# Altium integrated library Integrated_Library - 02.02.25 - 22.49.IntLib: 792 symbols (part 8 of 11) (continued)
## CMP-019-00011-3
designator U?, comment CJT1117-5.0
Low Dropout Linear Regulator, 1 A, 5 V, 0 to 125 degC, 4-Pin SOT223, RoHS, Tape and Reel; Manufacturer: Jiangsu Changjiang Electronics Technology; RoHS Compliant: Unknown; Mounting Technology: SM; Package Reference: SOT223-4; Case/Package: SOT223-4; Datasheet URL: https://statics3.seeedstudio.com/images/opl/datasheet/1310190P1.pdf; Package Description: 4-Pin Small Outline Transistor, Body 6.3 x 3.5 mm, Pitch 2.3 mm; Package URL: http://www.cj-elec.com/gallery/txUpfile/2013626129718915.pdf; Datasheet Version: Rev. A, 01/2012
footprint JSCJ-SOT223-4_M (SOT223, 4-Leads, Body 6.4x3.7mm, Pitch 2.3mm, IPC Low Density)
footprint JSCJ-SOT223-4_N (SOT223, 4-Leads, Body 6.4x3.7mm, Pitch 2.3mm, IPC Medium Density)
footprint JSCJ-SOT223-4_L (SOT223, 4-Leads, Body 6.4x3.7mm, Pitch 2.3mm, IPC High Density)
pins: 1 GND (power), 2 OUT (power), 3 IN (power), 4 TAB

## CMP-019-00012-3
designator U?, comment CN3065
Lithium Ion Battery Charger for Solar-Powered System, 4.4 to 6 V, 650 uA, -40 to 85 degC, 8-Pin DFN, RoHS; Manufacturer: Consonance Electronic; RoHS Compliant: Unknown; Package Reference: DFN-8; Datasheet URL: http://www.consonance-elec.com/pdf/datasheet/DSE-CN3065.pdf; Manufacturer URL: http://www.consonance-elec.com/; Datasheet Version: Rev. 1.0, 09/2009; Mounting Technology: SM; Case/Package: DFN-8; Package Description: 8-Pin Small Outline No-lead Package, Body 3 x 3 mm, Pitch 0.5 mm
footprint CONS-DFN-8_M (SON, 8-Leads, Body 3.1x3.1mm, Pitch 0.5mm, Thermal Pad 2.4x1.7mm, IPC Low Density)
footprint CONS-DFN-8_L (SON, 8-Leads, Body 3.10x3.10mm, Pitch 0.50mm, Thermal Pad 2.40x1.7mm, IPC High Density)
footprint CONS-DFN-8_N (SON, 8-Leads, Body 3.1x3.1mm, Pitch 0.5mm, Thermal Pad 2.4x1.7mm, IPC Medium Density)
pins: 1 TEMP (in) "Temperature Sense Input. Connecting TEMP pin to NTC thermistor’s output in Lithium ion battery pack. If TEMP pin’s voltage is below 46% of input supply voltage VIN for more than 0.15S, this means that batter(See Datasheet)", 2 ISET (in) "Constant Charge Current Setting and Charge Current Monitor Pin. The charge current is set by connecting a resistor RISET from this pin to GND. When in precharge mode, the ISET pin’s voltage is regulated to 0.2V. When i(See Datasheet)", 3 GND (power) "Ground Terminal.", 4 VIN (power) "Positive Input Supply Voltage. VIN is the power supply to the internal circuit. When VIN drops to within 40mv of the BAT pin voltage, CN3065 enters low power sleep mode, dropping BAT pin’s current to less than 3uA.", 5 BAT (power) "Battery Connection Pin. Connect the positive terminal of the battery to BAT pin. BAT pin draws less than 3uA current in chip disable mode or in sleep mode. BAT pin provides charge current to the battery and provides (See Datasheet)", 6 ~{DONE} (hiz) "Open-Drain Charge termination Status Output. In charge termination status, D\O\N\E\ is pulled low by an internal switch; Otherwise D\O\N\E\ pin is in high impedance state.", 7 ~{CHRG} (hiz) "Open Drain Charge Status Output. When the battery is being charged, the C\H\R\G\  pin is pulled low by an internal switch, otherwise C\H\R\G\ pin is in high impedance state.", 8 FB (in) "Battery Voltage Kevin Sense Input. This Pin can Kelvin sense the battery voltage; Also the regulation voltage in constant voltage mode can be adjusted by connecting an external resistor between FB pin and BAT pin.", 9 EP

## CMP-019-00013-3
designator U?, comment ETA3406S2F-T
Step-Down Converter, 1.5 MHz, 1.2 A, 2.6 to 6 VIN, -40 to 85 degC, 5-Pin SOT23, RoHS; Manufacturer: ETA solution; Datasheet URL: http://datasheet.octopart.com/ETA3406S2F-T-ETA-Solutions-datasheet-62330933.pdf; Package Reference: SOT23-5; Package Description: 5-Pin Small Outline Transistor, Body 2.9 x 1.65 mm, Pitch 0.95 mm; Datasheet Version: Apr-13; Manufacturer URL: http://www.etasolution.com/; Case/Package: SOT23-5; Mounting Technology: SM; RoHS Compliant: Unknown
footprint ETA-SOT23-5_M (SOT23, 5-Leads, Body 3.1x1.8mm, Pitch 0.95mm, IPC Low Density)
footprint ETA-SOT23-5_N (SOT23, 5-Leads, Body 3.1x1.8mm, Pitch 0.95mm, IPC Medium Density)
footprint ETA-SOT23-5_L (SOT23, 5-Leads, Body 3.1x1.8mm, Pitch 0.95mm, IPC High Density)
pins: 1 EN (in) "Enable pin for the IC. Drive this pin to high to enable the part, low to disable.", 2 GND (power) "Ground", 3 SW (power) "Inductor Connection. Connect an inductor Between SW and the regulator output.", 4 IN (power) "Supply Voltage. Bypass with a 10uF ceramic capacitor to GND", 5 FB (in) "Feedback Input. Connect an external resistor divider from the output to FB and GND to set the output to a voltage between 0.6V and VIN"

## CMP-019-00014-3
designator U?, comment MP1496DJ
High-Efficiency, Synchronous, Step-Down Converter, 2 A, 16 V, 500 KHz, -40 to 125 degC, 8-Pin TSOT23, RoHS, Tape and Reel; Manufacturer: Monolithic Power Systems; Package Reference: TSOT23-8; Datasheet URL: http://www.monolithicpower.com/DesktopModules/DocumentManage/API/Document/getDocument?id=443; RoHS Compliant: Unknown; Mounting Technology: SM; Case/Package: TSOT23-8; Manufacturer URL: http://www.monolithicpower.com/; Package Description: 8-Pin Small Outline Package Integrated Circuit, Body 1.6 x 2.9 mm, Pitch 0.65 mm; Datasheet Version: Rev. 1.05, 12/2012
footprint MPS-TSOT23-8_V (SOP, 8-Leads, Body 3x1.7mm, Pitch 0.65mm)
pins: 1 SS "Soft-Start. Connect an external capacitor to program the soft start time for the switch mode regulator.", 2 IN (power) "Supply Voltage. The MP1496 operates from a 4.5V-to-16V input rail. C1 decouples the input rail. Use wide PCB trace to make the connection.", 3 SW "Switch Output. Connect using a wide PCB trace.", 4 GND (power) "System Ground. Reference ground of the regulated output voltage. Use special care in PCB layout: Connect to GND with copper and vias.", 5 BST "Bootstrap. Connect a capacitor between SW and BST pins to form a floating supply across the high-side switch driver. A 10ohm resistor placed between SW and BST cap. is strongly recommended to reduce SW spike voltage.", 6 EN/SYNC "Enable/Synchronize. EN high to enable the MP1496. Apply an external clock to EN/SYNC pin to change the switching frequency", 7 VCC (power) "Bias Supply. Decouple with 0.1uF-to-0.22uF cap. The capacitance should not exceed 0.22uF. VCC capacitor should be put closely to VCC pin and GND pin.", 8 FB (in) "Feedback. Connect to the tap of an external resistor divider from the output to GND to set the output voltage. The frequency fold-back comparator lowers the oscillator frequency when the FB voltage is below 400mV to prevent (See Datasheet)"

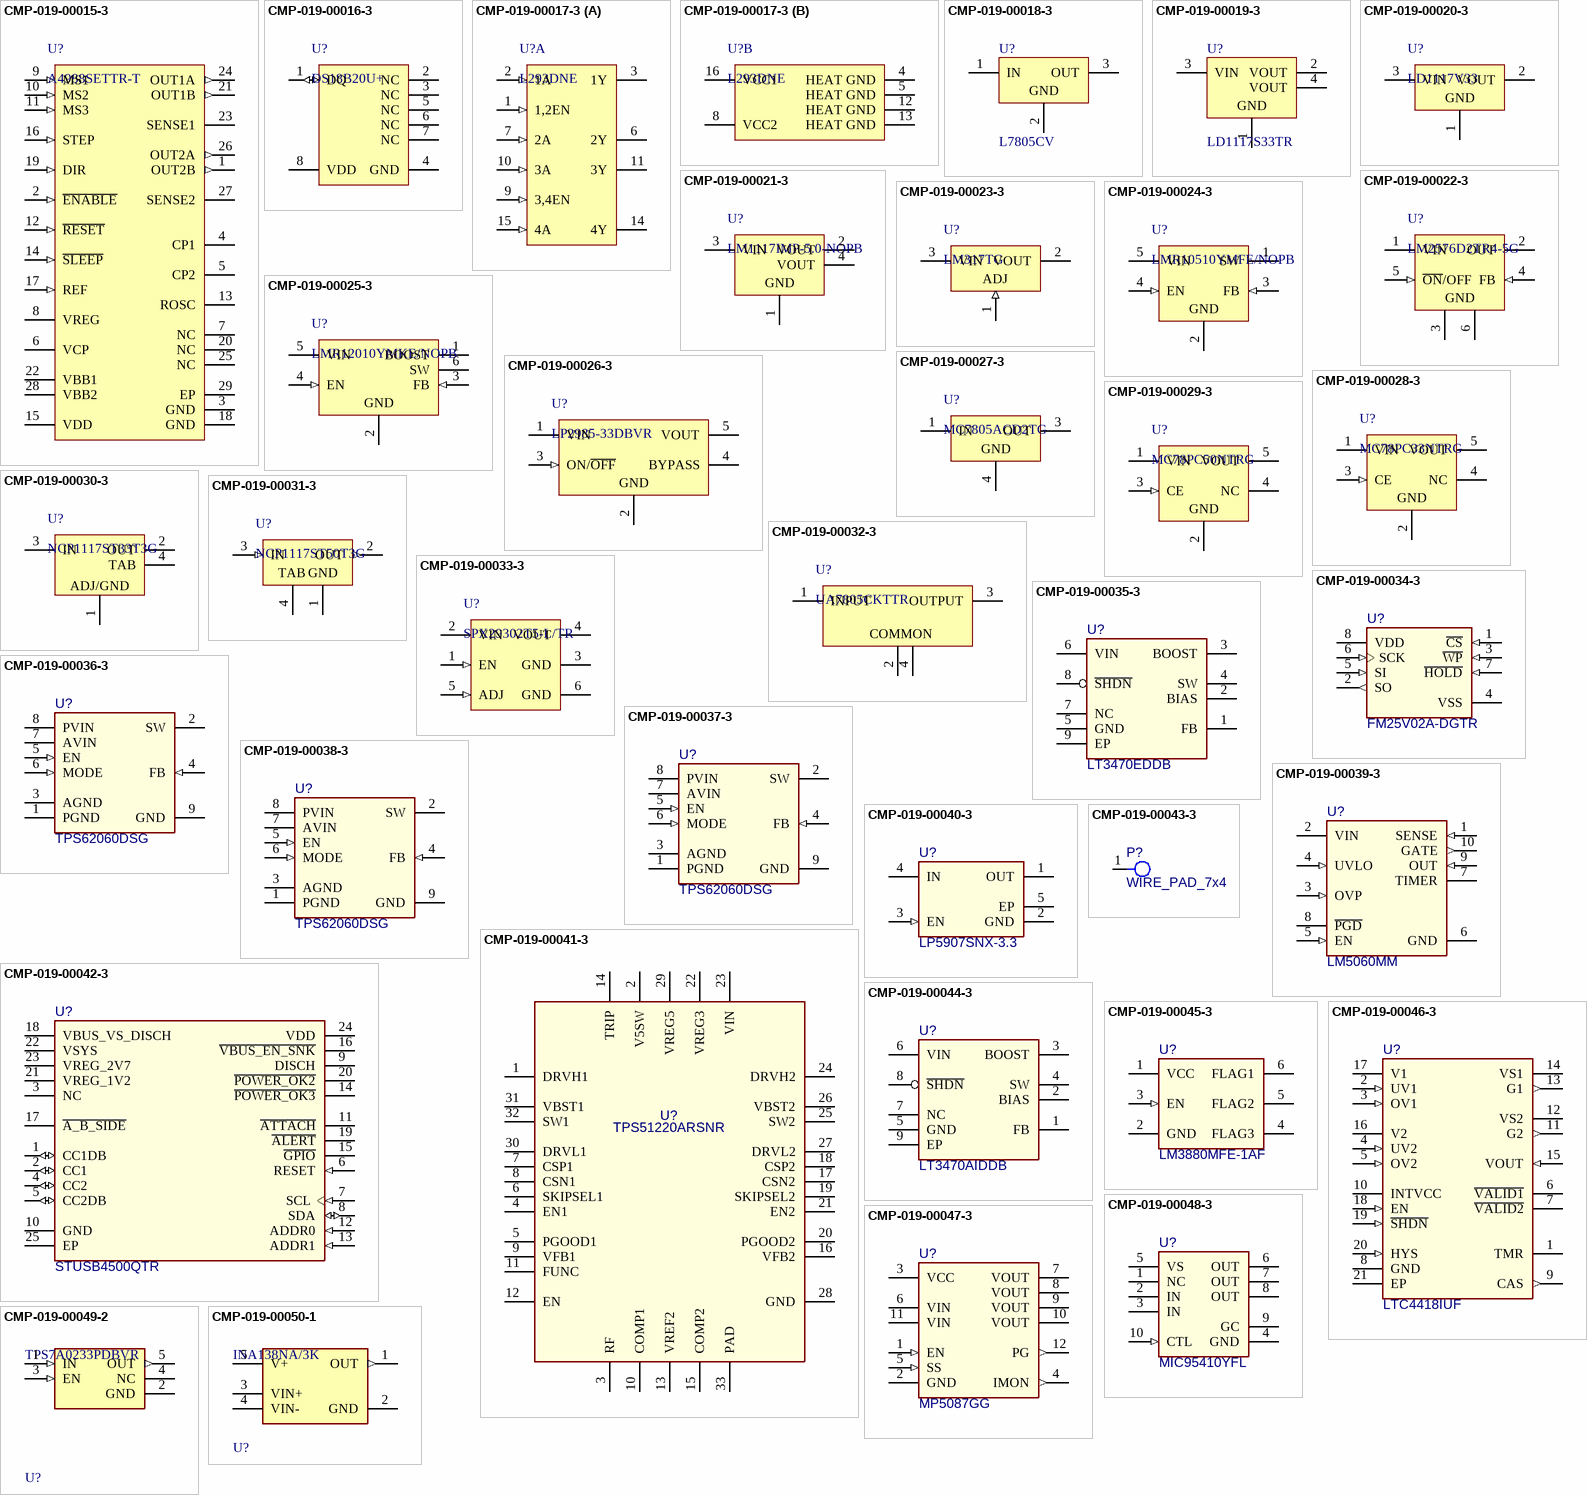
[diagram p19: symbols CMP-019-00015-3 to CMP-019-00050-1]

## CMP-019-00015-3
designator U?, comment A4988SETTR-T
DMOS Microstepping Driver with Translator and Overcurrent Protection, 3 to 5.5 V, -20 to 85 degC, 28-Pin QFN (ET), RoHS, Tape and Reel; Manufacturer: Allegro Microsystems; Output Voltage: 35V; Max Supply Voltage: 5V; Min Supply Voltage: 3V; Outputs: 1; Output Current: 2A; Max Operating Temperature: 85°C; Package Quantity: 1500; Packaging: TapeandReel; Pins: 28; RoHS Compliant: True; Datasheet Version: Rev. 6, 01/2016; Min Operating Temperature: -20°C; Mounting Technology: SM; Datasheet URL: http://www.allegromicro.com/en/Products/Part_Numbers/4988/4988.pdf; Package Reference: ET28; Manufacturer URL: http://www.allegromicro.com/; Case/Package: QFN; Package Description: 28-Pin Quad Flat No-lead Package, Body 5.15 x 5.15 mm, Pitch 0.5 mm
footprint ALEG-ET-28_V (QFN, 28-Leads, Body 5.15x5.15mm, Pitch 0.5mm, Thermal Pad 3.15x3.15mm)
pins: 1 OUT2B (out) "DMOS Full Bridge 2 Output B", 2 ~{ENABLE} (in) "Logic input", 3 GND (power) "Ground", 4 CP1 "Charge pump capacitor terminal", 5 CP2 "Charge pump capacitor terminal", 6 VCP "Reservoir capacitor terminal", 7 NC "No connection", 8 VREG "Regulator decoupling terminal", 9 MS1 (in) "Logic input", 10 MS2 (in) "Logic input", 11 MS3 (in) "Logic input", 12 ~{RESET} (in) "Logic input", 13 ROSC "Timing set", 14 ~{SLEEP} (in) "Logic input", 15 VDD (power) "Logic supply", 16 STEP (in) "Logic input", 17 REF (in) "Gm reference voltage input", 18 GND (power) "Ground", 19 DIR (in) "Logic input", 20 NC "No connection", 21 OUT1B (out) "DMOS Full Bridge 1 Output B", 22 VBB1 (power) "Load supply", 23 SENSE1 "Sense resistor terminal for Bridge 1", 24 OUT1A (out) "DMOS Full Bridge 1 Output A", 25 NC "No connection", 26 OUT2A (out) "DMOS Full Bridge 2 Output A", 27 SENSE2 "Sense resistor terminal for Bridge 2", 28 VBB2 (power) "Load supply", 29 EP (power) "Exposed pad for enhanced thermal dissipation"

## CMP-019-00016-3
designator U?, comment DS18B20U+
Programmable Resolution 1-Wire Digital Thermometer, -55 to 125 degC, 8-Pin SOP, RoHS, Tube; Manufacturer: Maxim; Interface: Serial; Max Supply Voltage (DC): 5V; Min Supply Voltage (DC): 3V; Nominal Supply Current: 1mA; Output Current: 4mA; Max Supply Voltage: 5.5V; Datasheet Version: Rev. 4, 01/2015; Package URL: http://pdfserv.maximintegrated.com/package_dwgs/21-0036.PDF; RoHS Compliant: True; Packaging: Rail/Tube; Datasheet URL: http://datasheets.maximintegrated.com/en/ds/DS18B20.pdf; Package Reference: U8+1; Case/Package: MSOP; Mounting Technology: SM; Min Operating Temperature: -55°C; Package Quantity: 50; Package Description: 8-Pin Small Outline Package Integrated Circuit, Body 3 x 3 mm, Pitch 0.65 mm; Max Operating Temperature: 125°C; Min Supply Voltage: 3V; Pins: 8; Manufacturer URL: http://www.maximintegrated.com/
footprint MAXM-U8+1_V (SOP, 8-Leads, Body 3.1x3.1mm, Pitch 0.65mm)
pins: 1 DQ (io) "Data Input/Output. Open-drain 1-Wire interface pin. Also provides power to the device when used in parasite power mode (see the Powering the DS18B20 section.)", 2 NC "No Connection", 3 NC "No Connection", 4 GND (power) "Ground", 5 NC "No Connection", 6 NC "No Connection", 7 NC "No Connection", 8 VDD (power) "Optional VDD. VDD must be grounded for operation in parasite power mode."

## CMP-019-00017-3
designator U?, comment L293DNE
Quadruple Half-H Driver, 1.2 A Peak, 4.5 to 36 V, 0 to 70 degC, 16-Pin DIP (NE), Pb-Free (RoHS), Tube; Manufacturer: Texas Instruments; Interface: Parallel; Package Version: 4040054/B, 04/1995; Outputs: 4; Min Supply Voltage: 4.5V; Max Supply Voltage: 36V; Output Current: 600mA; Manufacturer URL: http://www.ti.com/; Package Reference: NE0016A; Min Operating Temperature: 0°C; Package Quantity: 25; Datasheet Version: SLRS008D, 01/2016; Packaging: Rail/Tube; Case/Package: DIP; Package Description: 16-Pin Through Hole Device, Body 19.8 x 6.35 mm, Pitch 2.54 mm, Row Spacing 7.62 mm; Package URL: http://www.ti.com/lit/ml/mpdi003/mpdi003.pdf; Max Operating Temperature: 70°C; RoHS Compliant: True; Mounting Technology: TH; Datasheet URL: http://www.ti.com/general/docs/lit/getliterature.tsp?genericPartNumber=l293d&fileType=pdf; Output Voltage: 36V; Pins: 16
footprint NE0016A (DIP, 16-Leads, Body 19.8x6.6mm, Pitch 2.54mm, Row Spacing 7.62mm)
part A pins: 1 1,2EN (in), 2 1A (in), 3 1Y (hiz), 6 2Y (hiz), 7 2A (in), 9 3,4EN (in), 10 3A (in), 11 3Y (hiz), 14 4Y (hiz), 15 4A (in)
part B pins: 4 HEAT GND (power), 5 HEAT GND (power), 8 VCC2 (power), 12 HEAT GND (power), 13 HEAT GND (power), 16 VCC1 (power)

## CMP-019-00018-3
designator U?, comment L7805CV
Positive Voltage Regulator IC, 1.5 A, 5 V, 0 to 125 degC, 3-Pin TO-220, RoHS, Tube; Manufacturer: STMicroelectronics; Max Input Voltage: 35V; Min Supply Voltage: 8V; Nominal Output Voltage: 5V; Outputs: 1; Output Current: 1.5A; Dropout Voltage: 2V; Max Supply Voltage: 20V; Min Input Voltage: 7V; Datasheet Version: Rev 30, 09/2012; Min Operating Temperature: 0°C; Manufacturer URL: http://www.st.com/; Pins: 3; Mounting Technology: TH; Output Voltage: 5V; RoHS Compliant: True; Max Ouput Current: 1.5A; Datasheet URL: https://datasheet.ciiva.com/15111/getdatasheetpartid-44136-15111027.pdf; Packaging: Rail/Tube; Max Operating Temperature: 125°C; Case/Package: TO-220; Package Quantity: 50
footprint TO220 (TO, Thru-Hole, Vertical, Heatsink Mounted; 3 In-Line Leads; Pitch 2.54 mm)
pins: 1 IN (power), 2 GND (power), 3 OUT (power)

## CMP-019-00019-3
designator U?, comment LD1117S33TR
Low Drop Positive Voltage Regulator, 800 mA, Fixed 3.3 V Output, 0 to 125 degC, 3-Pin TO-220, RoHS, Tape and Reel; Manufacturer: STMicroelectronics; Max Supply Voltage: 15V; Dropout Voltage: 1.1V; Power: 12W; Output Current: 950mA; Min Input Voltage: 4.75V; Nominal Output Voltage: 3.3V; Max Ouput Current: 1.3A; Outputs: 1; Packaging: TapeandReel; Datasheet Version: Rev. 33, 11/2013; RoHS Compliant: True; Mounting Technology: SM; Max Input Voltage: 15V; Max Operating Temperature: 125°C; Package Reference: SOT-223; Package Quantity: 2500; Package Description: 4-Pin Small Outline Transistor, Body 6.5 x 3.5 mm, Pitch 2.3 mm; Case/Package: TO-261-4; Min Operating Temperature: 0°C; Datasheet URL: http://www.farnell.com/datasheets/1776449.pdf; Min Supply Voltage: 4.75V; Pins: 3; Output Voltage: 3.3V; Manufacturer URL: http://www.st.com/
footprint STM-SOT-223_M (SOT223, 4-Leads, Body 6.7x3.7mm, Pitch 2.3mm, IPC Low Density)
footprint STM-SOT-223_L (SOT223, 4-Leads, Body 6.7x3.7mm, Pitch 2.3mm, IPC High Density)
footprint STM-SOT-223_N (SOT223, 4-Leads, Body 6.7x3.7mm, Pitch 2.3mm, IPC Medium Density)
pins: 1 GND (power), 2 VOUT (power), 3 VIN (power), 4 VOUT (power)

## CMP-019-00020-3
designator U?, comment LD1117V33
Low Drop Positive Voltage Regulator, 800 mA, Fixed 3.3 V Output, 0 to 125 degC, 3-Pin TO-220, RoHS, Tube; Manufacturer: STMicroelectronics; Max Supply Voltage: 15V; Max Ouput Current: 800mA; Output Voltage: 3.3V; Power: 12W; Min Supply Voltage: 4.75V; Output Current: 1.3A; Outputs: 1; Min Input Voltage: 4.4V; Dropout Voltage: 1.1V; Datasheet Version: Rev. A, 07/2003; Case/Package: TO-220-3; Package Quantity: 50; Max Input Voltage: 15V; Manufacturer URL: http://www.st.com/; Min Operating Temperature: 0°C; Datasheet URL: http://www.farnell.com/datasheets/1776449.pdf; Max Operating Temperature: 125°C; Nominal Output Voltage: 3.3V; RoHS Compliant: True; Pins: 3; Packaging: Rail/Tube
footprint STM-TO220-3 (FM, 3-Leads, Body 10.4x4.6mm, Pitch 2.55mm)
pins: 1 GND (power), 2 VOUT (power), 3 VIN (power)

## CMP-019-00021-3
designator U?, comment LM1117IMP-5.0-NOPB
Low-Dropout Linear Regulator, 800 mA, -40 to 125 degC, 4-Pin SOT-223 (DCY), Green (RoHS & no Sb/Br), Tape and Reel; Manufacturer: Texas Instruments; Dropout Voltage: 1.2V; Nominal Output Voltage: 5V; Max Ouput Current: 800mA; Outputs: 1; Min Input Voltage: 2.6V; Max Input Voltage: 15V; Manufacturer URL: http://www.ti.com/; Max Operating Temperature: 125°C; Packaging: TapeandReel; RoHS Compliant: True; Output Voltage: 5V; Pins: 4; Package Description: 4-Pin Small Outline Transistor, Body 6.5 x 3.5 mm, Pitch 2.3 mm; Min Operating Temperature: -40°C; Mounting Technology: SM; Output Current: 800mA; Case/Package: SOT-223; Datasheet Version: SNOS412N, 01/2016; Datasheet URL: http://www.ti.com/lit/ds/symlink/lm1117.pdf; Package Reference: DCY0004A
footprint DCY0004A_M (SOT223, 4-Leads, Body 6.7x3.7mm, Pitch 2.3mm, IPC Low Density)
footprint DCY0004A_N (SOT223, 4-Leads, Body 6.7x3.7mm, Pitch 2.3mm, IPC Medium Density)
footprint DCY0004A_L (SOT223, 4-Leads, Body 6.5x3.5mm, Pitch 2.3mm, IPC High Density)
pins: 1 GND (power) "Ground pin for fixed output option.", 2 VOUT (power) "Output voltage pin for the regulator", 3 VIN (power) "Input voltage pin for the regulator", 4 VOUT (power) "Output voltage pin for the regulator"

## CMP-019-00022-3
designator U?, comment LM2576D2TR4-5G
Step-Down Switching Regulator, 3 A, 5 V, -40 to 125 degC, 5-Pin D2PAK (936A-02), RoHS, Tape and Reel; Manufacturer: ON Semiconductor; Min Input Voltage: 7V; Output Voltage: 5V; Frequency: 52kHz; Outputs: 1; Efficiency: 77%; Output Current: 3A; Max Input Voltage: 45V; Package Description: 5-Pin Transistor Outline, Body 10.02 x 9.1945 mm, Pitch 1.702 mm; Mounting Technology: SM; Min Operating Temperature: -40°C; RoHS Compliant: True; Package Quantity: 800; Datasheet Version: Rev. 8, 01/2006; Package Reference: D2PAK-5-936A-02; Manufacturer URL: http://www.onsemi.com/; Datasheet URL: http://www.onsemi.com/pub_link/Collateral/LM2576-D.PDF; Max Ouput Current: 3A; Max Operating Temperature: 125°C; Packaging: TapeandReel; Case/Package: TO-263-6
footprint ONSC-D2PAK-5-936A-02_V (DPAK, 5-Leads, Body 10.02x9.194mm, Pitch 1.702mm)
pins: 1 VIN (power) "This pin is the positive input supply for the LM2576 step-down switching regulator. In order to minimize voltage transients and to supply the switching currents needed by the regulator, a suitable input bypass capacitor must (See Datasheet)", 2 OUT (power) "This is the emitter of the internal switch. The saturation voltage Vsat of this output switch is typically 1.5 V. It should be kept in mind that the PCB area connected to this pin should be kept to a minimum in order to (See Datasheet)", 3 GND (power) "Circuit ground pin. See the information about the printed circuit board layout.", 4 FB (in) "This pin senses regulated output voltage to complete the feedback loop. The signal is divided by the internal resistor divider network R2, R1 and applied to the non-inverting input of the internal error amplifier. In the (See Datasheet)", 5 ~{ON}/OFF (in) "It allows the switching regulator circuit to be shut down using logic level signals, thus dropping the total input supply current to approximately 80 uA. The input threshold voltage is typically 1.4 V. Applying a voltage (See Datasheet)", 6 GND (power) "Heatsink surface (shown as terminal 6 in case outline drawing) is connected to Pin 3"

## CMP-019-00023-3
designator U?, comment LM317TG
Adjustable Output, Positive Voltage Regulator, 1.5 A, 0 to 125 degC, 3-Pin TO-220 (221AB-01), Pb-Free, Rail; Manufacturer: ON Semiconductor; Outputs: 1; Max Input Voltage: 40V; Min Input Voltage: 4.2V; Output Current: 1.5A; Output Voltage: 1.2V; Package Version: Rev. A, 11/2010; Mounting Technology: TH; Case/Package: TO-220; Package Description: 3-Pin Flange Mount, Vertical Straight Lead, Body 9.97 x 4.445 mm, Pitch 2.54 mm; Package Reference: TO-220-3-221AB-01; Manufacturer URL: http://www.onsemi.com/; Package Quantity: 50; Datasheet Version: Rev. 14, 01/2016; Max Ouput Current: 1.5A; Min Operating Temperature: 0°C; Packaging: Rail/Tube; Datasheet URL: http://www.onsemi.com/pub_link/Collateral/LM317-D.PDF; Max Operating Temperature: 125°C; RoHS Compliant: True; Pins: 3
footprint ONSC-TO-220-3-221AB-01 (FM, 3-Leads, Body 10.3x4.85mm, Pitch 2.54mm)
pins: 1 ADJ (in), 2 VOUT (power), 3 VIN (power)

## CMP-019-00024-3
designator U?, comment LMR10510YMFE/NOPB
Simple Switcher, Step-Down Voltage Regulator, 3 to 5.5 V Input, 1 A, 0.6 to 4.5 V Output, -40 to 125 degC, 5-Pin SOT-23 (DBV), Green (RoHS & no Sb/Br), Tape and Reel; Manufacturer: Texas Instruments; Max Ouput Current: 1A; Max Input Voltage: 5.5V; Outputs: 1; Min Input Voltage: 3V; Switching Frequency: 3MHz; Output Voltage: 4.5V; Case/Package: SOT-23-5; Pins: 5; Min Operating Temperature: -40°C; Package Description: 5-Pin Small Outline Transistor, Body 2.9 x 1.6 mm, Pitch 0.95 mm; Package Quantity: 250; Package Reference: DBV0005A; Datasheet URL: http://www.ti.com/lit/ds/symlink/lmr10510.pdf; Frequency: 3MHz; Mounting Technology: SM; Manufacturer URL: http://www.ti.com/; Datasheet Version: SNVS727B, 04/2013; Max Operating Temperature: 125°C; Packaging: TapeandReel; Output Current: 1A; Package URL: http://www.ti.com/lit/ml/mpds018l/mpds018l.pdf; RoHS Compliant: True
footprint DBV0005A_L (SOT23, 5-Leads, Body 3.05x1.75mm, Pitch 0.95mm, IPC High Density)
footprint DBV0005A_N (SOT23, 5-Leads, Body 3.05x1.75mm, Pitch 0.95mm, IPC Medium Density)
footprint DBV0005A_M (SOT23, 5-Leads, Body 3.05x1.75mm, Pitch 0.95mm, IPC Low Density)
pins: 1 SW (power) "Switch node. Connect to the inductor, output diode.", 2 GND (power) "Signal and power ground pin. Place the bottom resistor of the feedback network as close as possible to this pin.", 3 FB (in) "Feedback pin. Connect FB to external resistor divider to set output voltage.", 4 EN (in) "Shutdown control input. Logic high enables operation. Do not allow this pin to float or be greater than VIN + 0.3V.", 5 VIN (power) "input supply voltage."

## CMP-019-00025-3
designator U?, comment LMR12010YMKE/NOPB
Simple Switcher(R), Step-Down Voltage Regulator, 3 to 20 V Input, 1 A, 0.8 to 17 V Output, -40 to 125 degC, 6-Pin SOT23 (DDC), Green (RoHS & no Sb/Br), Tape and Reel; Manufacturer: Texas Instruments; Outputs: 1; Output Voltage: 17V; Switching Frequency: 3MHz; Max Input Voltage: 20V; Efficiency: 90%; Min Input Voltage: 3V; Max Ouput Current: 1A; RoHS Compliant: True; Case/Package: SOT-23-6; Package Quantity: 250; Frequency: 3MHz; Pins: 6; Manufacturer URL: http://www.ti.com/; Package URL: http://www.ti.com/lit/ml/mpds124d/mpds124d.pdf; Max Operating Temperature: 125°C; Min Operating Temperature: -40°C; Package Reference: DDC0006A; Datasheet URL: http://www.ti.com/lit/ds/symlink/lmr12010.pdf; Datasheet Version: SNVS731A, 09/2011; Packaging: TapeandReel; Output Current: 1A; Package Description: 6-Pin Small Outline Transistor, Body 2.9 x 1.6 mm, Pitch 0.95 mm; Mounting Technology: SM
footprint DDC0006A_M (SOT23, 6-Leads, Body 3.05x1.75mm, Pitch 0.95mm, IPC Low Density)
footprint DDC0006A_N (SOT23, 6-Leads, Body 3.05x1.75mm, Pitch 0.95mm, IPC Medium Density)
footprint DDC0006A_L (SOT23, 6-Leads, Body 3.05x1.75mm, Pitch 0.95mm, IPC High Density)
pins: 1 BOOST "Boost voltage that drives the internal NMOS control switch. A bootstrap capacitor is connected between the BOOST and SW pins.", 2 GND (power) "Signal and Power ground pin. Place the bottom resistor of the feedback network as close as possible to this pin for accurate regulation.", 3 FB (in) "Feedback pin. Connect FB to the external resistor divider to set output voltage.", 4 EN (in) "Enable control input. Logic high enables operation. Do not allow this pin to float or be greater than VIN + 0.3V.", 5 VIN (power) "Input supply voltage. Connect a bypass capacitor to this pin.", 6 SW (power) "Output switch. Connects to the inductor, catch diode, and bootstrap capacitor."

## CMP-019-00026-3
designator U?, comment LP2985-33DBVR
Single Output Low Noise LDO, 150 mA, Fixed 3.3 V Output, 1.5% Tolerance, 2.2 to 16 V Input, Low IQ, 5-Pin SOT-23 (DBV), -40 to 125 degC, Green (RoHS & no Sb/Br), Tape and Reel; Manufacturer: Texas Instruments; Output Current: 150mA; Package Version: 4073253-4/N, 12/2014; Outputs: 1; Dropout Voltage: 3mV; Output Voltage: 3.3V; Max Input Voltage: 16V; Min Input Voltage: 2.2V; Package Description: 5-Pin Small Outline Transistor, Body 2.9 x 1.6 mm, Pitch 0.95 mm; Mounting Technology: SM; Min Operating Temperature: -40°C; Case/Package: SOT-23-5; Datasheet Version: SLVS522O, 01/2015; Package Reference: DBV5; Max Ouput Current: 150mA; Max Operating Temperature: 125°C; RoHS Compliant: True; Packaging: TapeandReel; Nominal Output Voltage: 3.3V; Package Quantity: 3000; Package URL: http://www.ti.com/lit/ml/mpds018l/mpds018l.pdf; Pins: 16; Manufacturer URL: http://www.ti.com/; Datasheet URL: http://www.ti.com/lit/ds/symlink/lp2985.pdf
footprint TI-DBV5_V (SOT23, 5-Leads, Body 3.05x1.75mm, Pitch 0.95mm)
pins: 1 VIN (power), 2 GND (power), 3 ON/~{OFF} (in), 4 BYPASS, 5 VOUT (power)

## CMP-019-00027-3
designator U?, comment MC7805ACD2TG
Positive Voltage Regulator, 5 V Output Voltage, 1 A, 0 to 125 degC, 3-Pin D2PAK (936-03), Pb-Free, Tube; Manufacturer: ON Semiconductor; Min Input Voltage: 7V; Package Version: Rev. E, 09/2015; Output Voltage: 5V; Outputs: 1; Max Input Voltage: 35V; Output Current: 1A; Dropout Voltage: 2V; Mounting Technology: SM; Package Quantity: 50; Manufacturer URL: http://www.onsemi.com/; Package Reference: D2PAK-3-936-03; Nominal Output Voltage: 5V; Packaging: Rail/Tube; Max Operating Temperature: 125°C; Datasheet URL: http://www.onsemi.com/pub_link/Collateral/MC7800-D.PDF; RoHS Compliant: True; Datasheet Version: Rev. 27, 11/2014; Case/Package: TO-263-3; Min Operating Temperature: 0°C; Max Ouput Current: 1A; Package Description: 3-Pin Flange Mount, Body 10.02 x 9.1945 mm, Pitch 2.54 mm; Package URL: http://www.onsemi.com/pub_link/Collateral/936-03.PDF; Pins: 3
footprint ONSC-D2PAK-3-936-03_V (DPAK, 3-Leads, Body 10.24x9.35mm, Pitch 2.54mm)
pins: 1 IN (power), 3 OUT (power), 4 GND (power)

## CMP-019-00028-3
designator U?, comment MC78PC33NTRG
Low Noise Low Drop Out (LDO) Linear Voltage Regulator, 3.3 V Output Voltage, 150 mA, -40 to 85 degC, 5-Pin SOT-23 (1212-01), Pb-Free, Tape and Reel; Manufacturer: ON Semiconductor; Outputs: 1; Power Rating: 250mW; Nominal Output Voltage: 3.3V; Min Input Voltage: 4.3V; Dropout Voltage: 300mV; Max Ouput Current: 150mA; Max Input Voltage: 8V; Package Quantity: 3000; Mounting Technology: SM; Case/Package: SOT-23-5; RoHS Compliant: True; Datasheet Version: Rev. 6, 06/2005; Packaging: TapeandReel; Max Operating Temperature: 85°C; Power: 250mW; Output Voltage: 3.3V; Package Reference: SOT-23-5-1212-01_O; Manufacturer URL: http://www.onsemi.com/; Package Description: 5-Pin Small Outline Transistor, Body 2.9 x 1.65 mm, Pitch 0.95 mm; Output Current: 150mA; Datasheet URL: http://www.onsemi.com/pub_link/Collateral/MC78PC00-D.PDF; Min Operating Temperature: -40°C; Pins: 5
footprint ONSC-SOT-23-5-1212-01_O_V (SOT23, 5-Leads, Body 3x1.80mm, Pitch 0.95mm)
pins: 1 VIN (power) "Input Pin", 2 GND (power) "Ground Pin", 3 CE (in) "Chip Enable Pin", 4 NC "No Connection", 5 VOUT (power) "Output Pin"

## CMP-019-00029-3
designator U?, comment MC78PC50NTRG
Low Noise Low Drop Out (LDO) Linear Voltage Regulator, 5 V Output Voltage, 150 mA, -40 to 85 degC, 5-Pin SOT-23 (1212-01), Pb-Free, Tape and Reel; Manufacturer: ON Semiconductor; Dropout Voltage: 260mV; Outputs: 1; Power: 250mW; Output Current: 150mA; Max Input Voltage: 8V; Output Voltage: 5V; Package Quantity: 3000; Packaging: TapeandReel; Max Operating Temperature: 85°C; Mounting Technology: SM; Pins: 5; Datasheet Version: Rev. 6, 06/2005; Min Operating Temperature: -40°C; Package Description: 5-Pin Small Outline Transistor, Body 2.9 x 1.65 mm, Pitch 0.95 mm; Datasheet URL: http://www.onsemi.com/pub_link/Collateral/MC78PC00-D.PDF; RoHS Compliant: True; Case/Package: SOT-23-5; Manufacturer URL: http://www.onsemi.com/; Package Reference: SOT-23-5-1212-01_O
footprint ONSC-SOT-23-5-1212-01_O_V (SOT23, 5-Leads, Body 3x1.80mm, Pitch 0.95mm)
pins: 1 VIN (power) "Input Pin", 2 GND (power) "Ground Pin", 3 CE (in) "Chip Enable Pin", 4 NC "No Connection", 5 VOUT (power) "Output Pin"

## CMP-019-00030-3
designator U?, comment NCP1117ST33T3G
Low-Dropout Positive Fixed Voltage Regulator, 1 A, 3.3 V Output Voltage, 0 to 125 degC, 4-Pin SOT-223 (318H-01), Pb-Free, Tape and Reel; Manufacturer: ON Semiconductor; Max Supply Voltage: 15V; Min Input Voltage: 3.5V; Max Ouput Current: 1A; Output Voltage: 3.3V; Outputs: 1; Min Supply Voltage: 4.75V; Max Input Voltage: 20V; Dropout Voltage: 1.1V; Package Reference: SOT-223-4-318H-01_A; Package Quantity: 4000; Manufacturer URL: http://www.onsemi.com/; Mounting Technology: SM; Output Current: 1A; Min Operating Temperature: 0°C; Datasheet URL: http://www.onsemi.com/pub_link/Collateral/NCP1117-D.PDF; RoHS Compliant: True; Pins: 3; Case/Package: SOT-223-4; Packaging: TapeandReel; Max Operating Temperature: 125°C; Package Description: 4-Pin Small Outline Transistor, Body 6.5 x 3.5 mm, Pitch 2.3 mm; Nominal Output Voltage: 3.3V; Datasheet Version: Rev. 27, 09/2014
footprint ONSC-SOT-223-4-318H-01_A_V (SOT223, 4-Leads, Body 6.7x3.7mm, Pitch 2.3mm)
pins: 1 ADJ/GND, 2 OUT (power), 3 IN (power), 4 TAB

## CMP-019-00031-3
designator U?, comment NCP1117ST50T3G
Low-Dropout Positive Fixed Voltage Regulator, 1 A, 5 V Vout, 0 to 125 degC, 4-Pin SOT-223, Pb-Free, Tape and Reel; Manufacturer: ON Semiconductor; Current Rating: -600A; Output Voltage: 5V; Max Ouput Current: 1A; Max Input Voltage: 20V; Outputs: 1; Dropout Voltage: 1.2V; Min Input Voltage: 3.5V; Datasheet Version: Rev. 26, 08/2013; Package Quantity: 4000; Package Description: 4-Pin Small Outline Transistor, Body 6.5 x 3.5 mm, Pitch 2.3 mm; RoHS Compliant: True; Max Operating Temperature: 125°C; Nominal Output Voltage: 5V; Datasheet URL: https://datasheet.ciiva.com/28483/1748260-28483320.pdf; Min Operating Temperature: 0°C; Manufacturer URL: http://www.onsemi.com/; Output Current: 1A; Pins: 3; Mounting Technology: SM; Package Reference: SOT-223-4-318H-01_A; Case/Package: TO-261-4; Packaging: TapeandReel
footprint ONSC-SOT-223-4-318H-01_A_V (SOT223, 4-Leads, Body 6.7x3.7mm, Pitch 2.3mm)
pins: 1 GND (power), 2 OUT (out), 3 IN (in), 4 TAB (power)

## CMP-019-00032-3
designator U?, comment UA7805CKTTR
Fixed Positive Voltage Regulator, 7 to 25 V, 1.5 A, 0 to 125 degC, 3-Pin DDPAK (KTT), Green (RoHS & no Sb/Br), Tape and Reel; Manufacturer: Texas Instruments; Max Ouput Current: 1.5A; Min Input Voltage: 7V; Nominal Output Voltage: 5V; Outputs: 1; Dropout Voltage: 2V; Max Input Voltage: 25V; Manufacturer URL: http://www.ti.com/; Package Reference: KTT0003A; Pins: 3; Min Operating Temperature: 0°C; Mounting Technology: SM; Package Quantity: 500; Packaging: TapeandReel; Datasheet URL: http://www.ti.com/lit/ds/symlink/ua7805.pdf; Case/Package: TO-263-4; Output Voltage: 5V; RoHS Compliant: True; Datasheet Version: SLVS056P, 01/2015; Output Current: 1.5A; Package Description: 3-Pin Surface Mount Device, Body 10.16 x 9.015 mm, Pitch 2.54 mm; Max Operating Temperature: 125°C
footprint KTT0003A_V (DPAK, 3-Leads, Body 10.65x9.65mm, Pitch 2.54mm)
pins: 1 INPUT (power) "Supply Input", 2 COMMON (power) "Ground", 3 OUTPUT (power) "Voltage Output", 4 COMMON (power) "Ground"

## CMP-019-00033-3
designator U?, comment SPX29302T5-L/TR
Highly Accurate Voltage Regulator, 3 A, 1.25 to 16 V, -40 to 125 degC, 6-Pin DPAK, RoHS, Tape and Reel; Manufacturer: Exar Corporation; Pins: 6; Manufacturer URL: https://www.exar.com/; Package Description: 6-Pin Transistor Outline, Body 9.015 x 10.16 mm, Pitch 1.7 mm; Datasheet URL: https://www.exar.com/content/document.ashx?id=1328; Mounting Technology: SM; Max Operating Temperature: 125°C; RoHS Compliant: True; Package Reference: DPAK; Packaging: TapeandReel; Datasheet Version: Rev. 2.1.0, 10/2011; Min Operating Temperature: -40°C; Voltage: 1.25to16V; Case/Package: DPAK
footprint EXAR-TO263-5_N (D2-PAK, 6-Pads, Body 9.02x10.15mm, IPC Medium Density)
footprint EXAR-TO263-5_L (D2-PAK, 6-Pads, Body 9.02x10.15mm, IPC High Density)
footprint EXAR-TO263-5_M (D2-PAK, 6-Pads, Body 9.02x10.15mm, IPC Low Density)
pins: 1 EN (in), 2 VIN (power), 3 GND (power), 4 VOUT (power), 5 ADJ (in), 6 GND (power)

## CMP-019-00034-3
designator U?, comment FM25V02A-DGTR
REEL / F-RAM Memory Serial; Speed: 40MHz; Memory Format: FRAM,RAM; Pins: 8; Min Operating Temperature: -40°C; Case/Package: DFN; Max Operating Temperature: 85°C
footprint SON95P400X75_HS-9N (SON, 8-Leads, Body 4,50x4,00mm, Pitch 0,95mm, Thermal Pad 2,61x2,88mm, IPC Medium Density)
footprint SON95P400X75_HS-9N (SON, 8-Leads, Body 4,50x4,00mm, Pitch 0,95mm, Thermal Pad 2,61x2,88mm, IPC Medium Density)
pins: 1 ~{CS} (in) "Chip Select. This active LOW input activates the device. When HIGH, the device enters the  low-power standby mode, ignores other inputs, and the output is tristated. When LOW, the device  internally activates the SCK signal. A falling edge on C\S\ must occur before every opcode.", 2 SO (out) "Serial Output. This is the data output pin. It is driven during a read and remains tristated at all other  times including when H\O\L\D\ is LOW. Data transitions are driven on the falling edge of the serial clock.", 3 ~{WP} (in) "Write Protect. This active LOW pin prevents write operation to the Status Register when WPEN is  set to ‘1’. This is critical because other write protection features are controlled through the Status  Register.", 4 VSS (power) "Ground for the device. Must be connected to the ground of the system.", 5 SI (in) "Serial Input. All data is input to the device on this pin. The pin is sampled on the rising edge of SCK  and is ignored at other times. It should always be driven to a valid logic level to meet IDD specifications.", 6 SCK (in) "Serial Clock. All I/O activity is synchronized to the serial clock. Inputs are latched on the rising edge  and outputs occur on the falling edge. Because the device is synchronous, the clock frequency may  be any value between 0 and 40 MHz and may be interrupted at any time.", 7 ~{HOLD} (in) "The H\O\L\D\ pin is used when the host CPU must interrupt a memory operation for another  task. When H\O\L\D\ is LOW, the current operation is suspended. The device ignores any transition  on SCK or C\S\. All transitions on H\O\L\D\ must occur while SCK is LOW. This pin has a weak internal  pull-up", 8 VDD (power) "Power supply input to the device."

## CMP-019-00035-3
designator U?, comment LT3470EDDB
Micropower Buck Regulator with Integrated Boost and Catch Diode, 8-pin SON (DDB-8), -40 to 85 degC, Tape and Reel; Output Voltage: 16V; Pins: 9; Case/Package: DFN; Min Operating Temperature: -40°C; Max Operating Temperature: 85°C
footprint LT-DDB-8_V (SON, 8-Leads, Body 3x2mm, Pitch 0.5mm, Thermal Pad 2.2x0.61mm)
footprint LT-DDB-8_V (SON, 8-Leads, Body 3x2mm, Pitch 0.5mm, Thermal Pad 2.2x0.61mm)
pins: 1 FB "The LT3470X regulates its feedback pin to 1.25V. Connect the feedback resistor divider tap to this pin. Set the output voltage according to VOUT = 1.25V (1 + R1/R2) or R1 = R2 (VOUT/1.25 - 1).", 2 BIAS (power) "The BIAS pin connects to the internal boost Schottky diode and to the internal regulator. Tie to VOUT when VOUT > 2.5V or to VIN otherwise. When VBIAS > 3V the BIAS pin will supply current to the internal regulator.", 3 BOOST "The BOOST pin is used to provide a drive voltage, which is higher than the input voltage, to the internal bipolar NPN power switch.", 4 SW (power) "The SW pin is the output of the internal power switch. Connect this pin to the inductor, catch diode and boost capacitor.", 5 GND "This pin can be left floating, connected to VIN, or tied to GND.", 6 VIN (power) "The VIN pin supplies current to the LT3470X’s internal regulator and to the internal power switch. This pin must be locally bypassed.", 7 NC "This pin can be left floating, connected to VIN, or tied to GND.", 8 ~{SHDN} "The S\H\D\N\ pin is used to put the LT3470X in shutdown mode. Tie to ground to shut down the LT3470A. Apply 2V or more for normal operation. If the shutdown feature is not used, tie this pin to the VIN pin.", 9 EP "This pin can be left floating, connected to VIN, or tied to GND."

## CMP-019-00036-3
designator U?, comment TPS62060DSG
Step Down Converter, 3 MHz, 1.6 A, -45 to 85 degC, 8-Pin WSON, RoHS, Tape and Reel; Pins: 9
footprint DSG0008A_V (SON, 8-Leads, Body 2x2mm, Pitch 0.5mm, Thermal Pad 1.6x0.9mm, TI Recommended)
footprint DSG0008A_V (SON, 8-Leads, Body 2x2mm, Pitch 0.5mm, Thermal Pad 1.6x0.9mm, TI Recommended)
pins: 1 PGND (power) "GND supply pin for the output stage.", 2 SW (power) "This is the switch pin and is connected to the internal MOSFET switches. Connect the external inductor between this terminal and the output capacitor.", 3 AGND (power) "Analog GND supply pin for the control circuit.", 4 FB (in) "Feedback pin for the internal regulation loop. Connect the external resistor divider to this pin. In case of fixed output voltage option, connect this pin directly to the output capacitor", 5 EN (in) "This is the enable pin of the device. Pulling this pin to low forces the device into shutdown mode. Pulling this pin to high enables the device. This pin must be terminated", 6 MODE (in) "MODE: MODE pin = high forces the device to operate in fixed frequency PWM mode. MODE pin = low enables the Power Save Mode with automatic transition from PFM mode to fixed frequency PWM mode.", 7 AVIN (power) "Analog VIN power supply for the control circuit. Need to be connected to PVIN and input capacitor.", 8 PVIN (power) "VIN power supply pin for the output stage.", 9 GND (power) "For good thermal performance, this PAD must be soldered to the land pattern on the pcb. This PAD should be used as device GND."